# Altium footprint library MyLib.PcbLib: 575 footprints (part 13 of 36)
Each footprint in its own frame and in the unit in brackets; x right, y up, seen from the top. Pads: shape width x height; smd on the part's side, far side on the other; paste and mask are expansions set on the pad; w line width, h text height; cw(c..) or ccw(c..) is an arc to the next point about the centre after c.
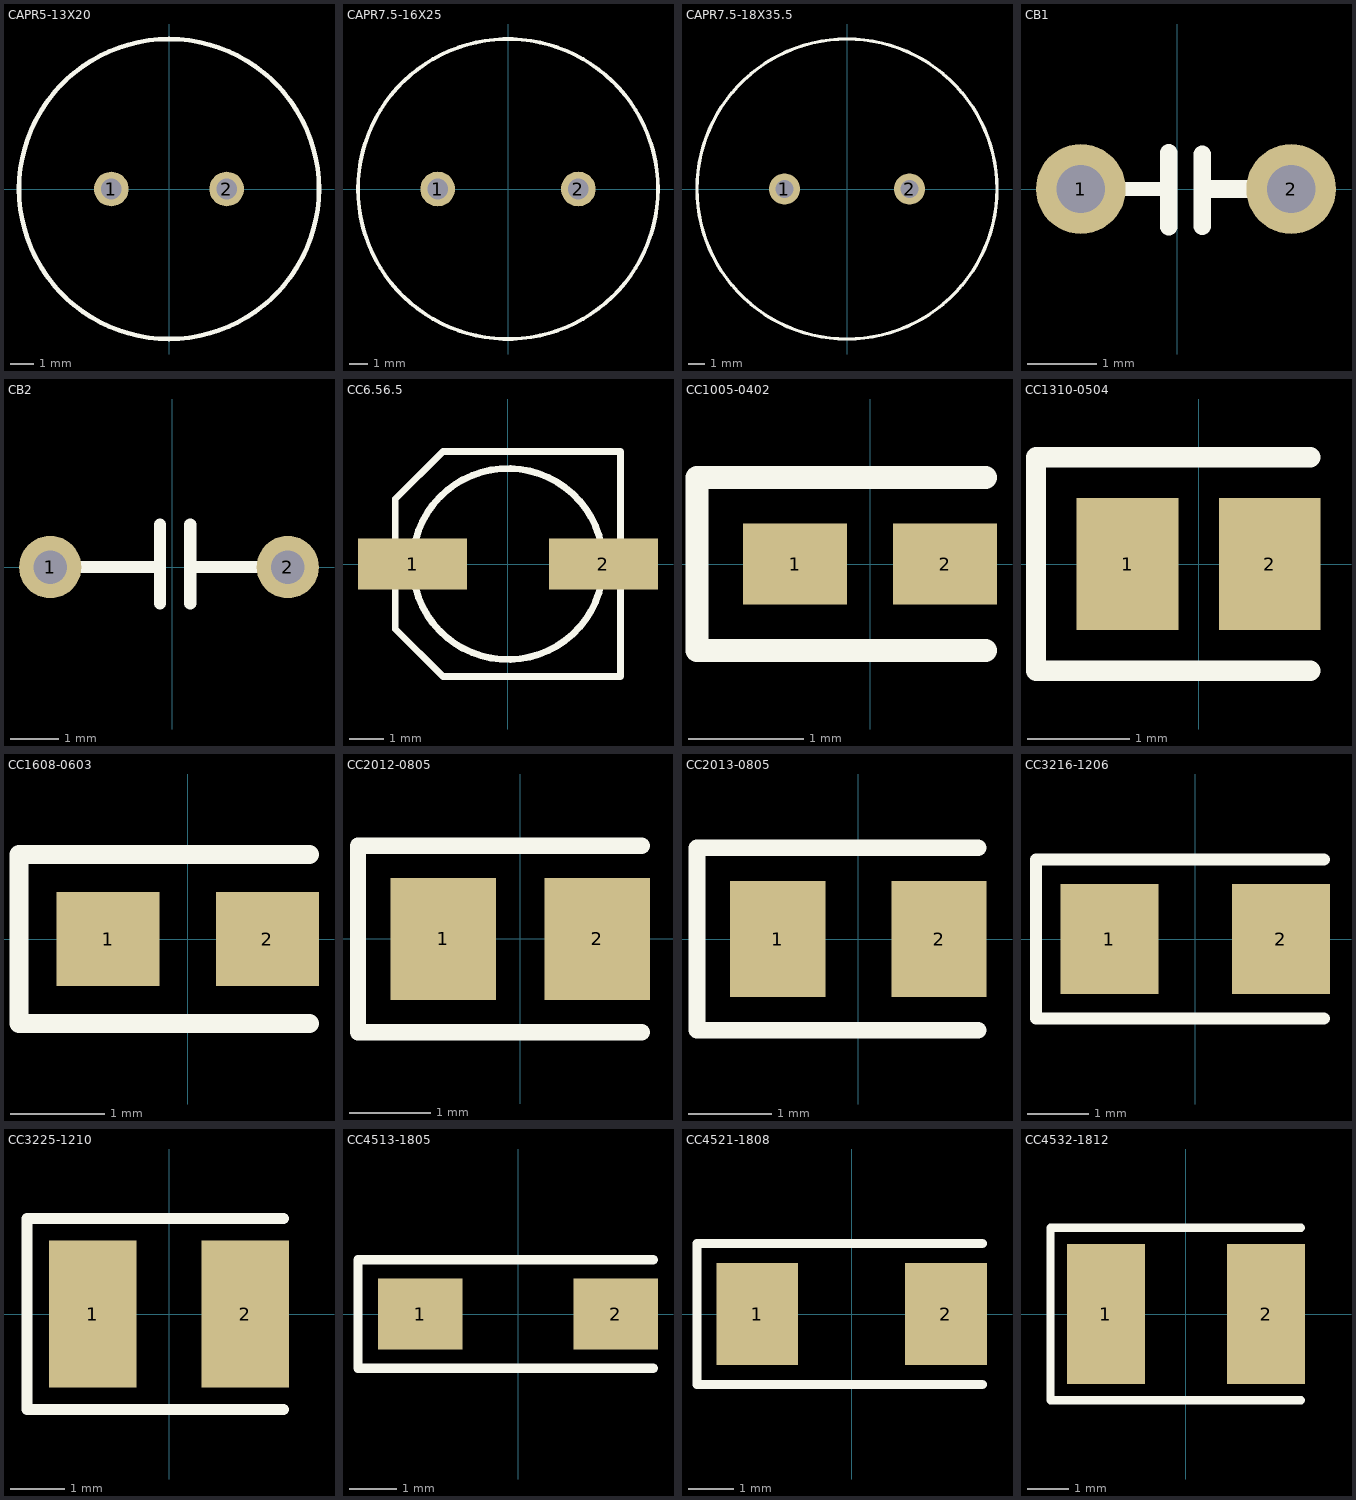
[diagram p12: the footprints below, top view; thin cyan lines are the x and y axes]

## CAPR5-13X20 [mm]
pads (2):
  round 1.5 hole 0.9: 1(-2.5,0) 2(2.5,0)
Top Overlay:
  circle w0.2: c0,0 r6.5
3D body: height 20, standoff 0.2, extent -6.499,-6.499 6.499,6.499

## CAPR7.5-16X25 [mm]
pads (2):
  round 1.85 hole 1.1: 1(-3.75,0) 2(3.75,0)
Top Overlay:
  circle w0.2: c0,0 r8
3D body: height 16, standoff 0.2, extent -8,-8 8,8

## CAPR7.5-18X35.5 [mm]
pads (2):
  round 1.85 hole 1.1: 1(-3.75,0) 2(3.75,0)
Top Overlay:
  circle w0.2: c0,0 r9
3D body: height 35.5, standoff 0.2, extent -8.999,-8.999 8.999,8.999

## CB1 [mm]
pads (2):
  round 1.3 hole 0.7: 1(-1.397,0) 2(1.651,0)
Top Overlay:
  lines w0.203: -1.397,0 -0.254,0
  lines w0.254: -0.126,0.522 -0.125,-0.546 ; 0.36,-0.54 0.36,0.504 ; 0.381,0 1.651,0
3D body "Cap 0_2in pitch.STEP": height 5.5, standoff -3.33, extent -2.75,-1.23 2.75,1.27

## CB2 [mm]
pads (2):
  round 1.3 hole 0.7: 1(-2.54,0) 2(2.413,0)
Top Overlay:
  lines w0.254: -1.905,0 -1.27,0 -0.254,0 ; -0.254,-0.762 -0.254,0.889 ; 0.381,-0.762 0.381,0.889 ; 0.508,0 2.413,0
3D body "CAP TR 0.2in pitch.STEP": height 1.19, standoff -7.31, extent -3.627,-0.848 3.372,0.848

## CC6.56.5 [mm]
pads (2):
  rect 3.2x1.5 smd: 1(-2.794,0) 2(2.8,0)
Top Overlay:
  circle w0.2: c0,0 r2.8
  lines w0.2: -3.302,-1.905 -1.905,-3.302 3.302,-3.302 3.302,3.302 -1.905,3.302 -3.302,1.905 -3.302,-1.905
3D body: height 5.2, standoff 0, extent -3.5,-3.3 3.5,3.3

## CC1005-0402 [mm]
pads (2):
  rect 0.9x0.7 smd: 1(-0.65,0) 2(0.65,0)
Top Overlay:
  lines w0.2: 1,-0.75 -1.5,-0.75 -1.5,0.75 1,0.75
3D body: height 0.3, standoff 0, extent -0.5,-0.25 0.5,0.25

## CC1310-0504 [mm]
pads (2):
  rect 1x1.3 smd: 1(-0.7,0) 2(0.7,0)
Top Overlay:
  lines w0.2: 1.1,-1.05 -1.6,-1.05 -1.6,1.05 1.1,1.05

## CC1608-0603 [mm]
pads (2):
  rect 1.1x1 smd: 1(-0.85,0) 2(0.85,0)
Top Overlay:
  lines w0.2: 1.3,-0.9 -1.8,-0.9 -1.8,0.9 1.3,0.9
3D body: height 0.3, standoff 0, extent -0.8,-0.4 0.8,0.4

## CC2012-0805 [mm]
pads (2):
  rect 1.3x1.5 smd: 1(-0.95,0) 2(0.95,0)
Top Overlay:
  lines w0.2: 1.5,-1.15 -2,-1.15 -2,1.15 1.5,1.15
3D body "CC0805.STEP": height 0.5, standoff 0, extent -1,-0.625 1,0.625

## CC2013-0805 [mm]
pads (2):
  rect 1.15x1.4 smd: 1(-0.975,0) 2(0.975,0)
Top Overlay:
  lines w0.2: 1.45,-1.1 -1.95,-1.1 -1.95,1.1 1.45,1.1
3D body: height 0.5, standoff 0, extent -1,-0.625 1,0.625

## CC3216-1206 [mm]
pads (2):
  rect 1.6x1.8 smd: 1(-1.4,0) 2(1.4,0)
Top Overlay:
  lines w0.2: 2.1,-1.3 -2.6,-1.3 -2.6,1.3 2.1,1.3
3D body: height 0.5, standoff 0, extent -1,-0.625 1,0.625

## CC3225-1210 [mm]
pads (2):
  rect 1.6x2.7 smd: 1(-1.4,0) 2(1.4,0)
Top Overlay:
  lines w0.2: 2.1,-1.75 -2.6,-1.75 -2.6,1.75 2.1,1.75

## CC4513-1805 [mm]
pads (2):
  rect 1.8x1.5 smd: 1(-2.075,0) 2(2.075,0)
Top Overlay:
  lines w0.2: 2.875,-1.15 -3.4,-1.15 -3.4,1.15 2.875,1.15

## CC4521-1808 [mm]
pads (2):
  rect 1.8x2.25 smd: 1(-2.075,0) 2(2.075,0)
Top Overlay:
  lines w0.2: 2.875,-1.55 -3.4,-1.55 -3.4,1.55 2.875,1.55

## CC4532-1812 [mm]
pads (2):
  rect 1.9x3.4 smd: 1(-1.95,0) 2(1.95,0)
Top Overlay:
  lines w0.2: 2.8,-2.1 -3.3,-2.1 -3.3,2.1 2.8,2.1